# Altium schematic symbol library BARKO_SCHLIB.SchLib: 1064 symbols (part 7 of 11) (continued)
## IC-STM32H743VIH6 (continued)
part C pins: A1 PC14-OSC32 IN (io), A3 PE2-DEBUG_TRACECLK,DEBUG_TRACECLK,SAI1_CK1,SPI4_SCK,SAI1_MCLK_A,SAI4_MCLK_A,QUADSPI_BK1_IO2,SAI4_CK1,ETH_TXD3,FMC_A23, (io), B1 PC15-OSC32 OUT (io), B3 PE3-DEBUG_TRACED0,DEBUG_TRACED0,TIM15_BKIN,SAI1_SD_B,SAI4_SD_B,FMC_A19, (io), B6 PD5-HRTIM_EEV3,USART2_TX,FMC_NWE, (io), B7 PD2-DEBUG_TRACED2,DEBUG_TRACED2,TIM3_ETR,UART5_RX,SDMMC1_CMD,DCMI_D11, (io), C1 PH0-OSC IN (io), C3 PE4-DEBUG_TRACED1,DEBUG_TRACED1,SAI1_D2,DFSDM1_DATIN3,TIM15_CH1N,SPI4_NSS,SAI1_FS_A,SAI4_FS_A,SAI4_D2,FMC_A20,DCMI_D4,LTDC_B0, (io), C4 PE1-LPTIM1_IN2,HRTIM_SCOUT,UART8_TX,FMC_NBL1,DCMI_D3, (io), C6 PD6-SAI1_D1,DFSDM1_CKIN4,DFSDM1_DATIN1,I2S3_SDO/SPI3_MOSI,SAI1_SD_A,USART2_RX,SAI4_SD_A,SAI4_D1,SDMMC2_CK,FMC_NWAIT,DCMI_D10,LTDC_B2, (io), C7 PD3-DFSDM1_CKOUT,I2S2_CK/SPI2_SCK,USART2_CTS/USART2_NSS,FMC_CLK,DCMI_D5,LTDC_G7, (io), D1 PH1-OSC OUT (io), D3 PE5-DEBUG_TRACED2,DEBUG_TRACED2,SAI1_CK2,DFSDM1_CKIN3,TIM15_CH1,SPI4_MISO,SAI1_SCK_A,SAI4_SCK_A,SAI4_CK2,FMC_A21,DCMI_D6,LTDC_G0, (io), D4 PE0-LPTIM1_ETR,TIM4_ETR,HRTIM_SCIN,LPTIM2_ETR,UART8_RX,SAI2_MCLK_A,FMC_NBL0,DCMI_D2, (io), D5 BOOT0 (io), D6 PD7-DFSDM1_DATIN4,I2S1_SDO/SPI1_MOSI,DFSDM1_CKIN1,USART2_CK,SPDIFRX1_IN0,SDMMC2_CMD,FMC_NE1, (io), D7 PD4-HRTIM_FLT3,SAI3_FS_A,USART2_DE/USART2_RTS,FMC_NOE, (io), D8 PD0-DFSDM1_CKIN6,SAI3_SCK_A,UART4_RX,FDCAN1_RX,FMC_D2/FMC_DA2, (io), E1 ~{RST} (in), E3 PE6-DEBUG_TRACED3,DEBUG_TRACED3,TIM1_BKIN2,SAI1_D1,TIM15_CH2,SPI4_MOSI,SAI1_SD_A,SAI4_SD_A,SAI4_D1,SAI2_MCLK_B,TIM1_BKIN2_COMP1/TIM1_BKIN2_COMP2,FMC_A22,DCMI_D7,LTDC_G1, (io), E8 PD1-DFSDM1_DATIN6,SAI3_SD_A,UART4_TX,FDCAN1_TX,FMC_D3/FMC_DA3, (io), F7 PDR ON (io), G6 PE10-TIM1_CH2N,DFSDM1_DATIN4,UART7_CTS,QUADSPI_BK2_IO3,FMC_D7/FMC_DA7, (io), G7 PE14-TIM1_CH4,SPI4_MOSI,SAI2_MCLK_B,FMC_D11/FMC_DA11,LTDC_CLK, (io), G8 PD15-TIM4_CH4,SAI3_MCLK_A,UART8_DE/UART8_RTS,FMC_D1/FMC_DA1, (io), G9 PD11-LPTIM2_IN2,I2C4_SMBA,USART3_CTS/USART3_NSS,QUADSPI_BK1_IO0,SAI2_SD_A,FMC_A16, (io), H5 PE7-TIM1_ETR,DFSDM1_DATIN2,UART7_RX,QUADSPI_BK2_IO0,FMC_D4/FMC_DA4, (io), H6 PE11-TIM1_CH2,DFSDM1_CKIN4,SPI4_NSS,SAI2_SD_B,FMC_D8/FMC_DA8,LTDC_G3, (io), H7 PE15-TIM1_BKIN,FMC_D12/FMC_DA12,TIM1_BKIN_COMP1/TIM1_BKIN_COMP2,LTDC_R7, (io), H8 PD14-TIM4_CH3,SAI3_MCLK_B,UART8_CTS,FMC_D0/FMC_DA0, (io), H9 PD10-DFSDM1_CKOUT,SAI3_FS_B,USART3_CK,FMC_D15/FMC_DA15,LTDC_B3, (io), J5 PE8-TIM1_CH1N,DFSDM1_CKIN2,UART7_TX,QUADSPI_BK2_IO1,FMC_D5/FMC_DA5,COMP2_OUT, (io), J6 PE12-TIM1_CH3N,DFSDM1_DATIN5,SPI4_SCK,SAI2_SCK_B,FMC_D9/FMC_DA9,COMP1_OUT,LTDC_B4, (io), J9 PD9-DFSDM1_DATIN3,SAI3_SD_B,USART3_RX,FMC_D14/FMC_DA14, (io), J10 PD13-LPTIM1_OUT,TIM4_CH2,I2C4_SDA,QUADSPI_BK1_IO3,SAI2_SCK_A,FMC_A18, (io), K5 PE9-TIM1_CH1,DFSDM1_CKOUT,UART7_DE/UART7_RTS,QUADSPI_BK2_IO2,FMC_D6/FMC_DA6, (io), K6 PE13-TIM1_CH3,DFSDM1_CKIN5,SPI4_MISO,SAI2_FS_B,FMC_D10/FMC_DA10,COMP2_OUT,LTDC_DE, (io), K9 PD8-DFSDM1_CKIN3,SAI3_SCK_B,USART3_TX,SPDIFRX1_IN1,FMC_D13/FMC_DA13, (io), K10 PD12-LPTIM1_IN1,TIM4_CH1,LPTIM2_IN1,I2C4_SCL,USART3_DE/USART3_RTS,QUADSPI_BK1_IO1,SAI2_FS_A,FMC_A17, (io)

## IC-STM32L010K8T6
designator U?, comment STM32L010K8T6
16/32-BITS MICROS; Manufacturer: STMicroelectronics; .Creator: M.OZKAN; .PCBCHK: USED; Supplier 1: Digi-Key; Supplier Part Number 1: 497-19365-ND; Manufacturer Part Number: STM32L010K8T6; Stock: 300; Pricing: 1=1.87, 10=1.679, 25=1.584, 100=1.3496, 250=1.2672, 500=1.1088, 1000=0.9187, 2500=0.8554, 5000=0.8237 (USD); RoHS: No; ComponentLink1URL: http://www.farnell.com/datasheets/2710893.pdf?src-supplier=Farnell; ComponentLink1Description: http://www.farnell.com/datasheets/2710893.pdf?src-supplier=Farnell; .SCHCHK: USED
footprint LQFP32
pins: 1 VDD (power), 2 PC14-OSC32 IN (io), 3 PC15-OSC32 OUT (io), 4 ~{RST} (in), 5 VDDA (power), 6 PA0 (io), 7 PA1 (io), 8 PA2 (io), 9 PA3 (io), 10 PA4 (io), 11 PA5 (io), 12 PA6 (io), 13 PA7 (io), 14 PB0 (io), 15 PB1 (io), 16 VSS (power), 17 VDD (power), 18 PA8 (io), 19 PA9 (io), 20 PA10 (io), 21 PA11 (io), 22 PA12 (io), 23 PA13 (io), 24 PA14 (io), 25 PA15 (io), 26 PB3 (io), 27 PB4 (io), 28 PB5 (io), 29 PB6 (io), 30 PB7 (io), 31 BOOT0 (in), 32 VSS (power)

## IC-STM32L431KBU6
designator U?, comment STM32L431KBU6
IC MCU 32BIT 128KB FLASH; Manufacturer: STMicroelectronics; Interface: I2C,SPI,IrDA,UART,USART; Peripherals: Brown-out Detect/Reset,PWM,WDT,DMA; Core Architecture: ARM; Frequency: 80MHz; Number of I/Os: 26; Oscillator Type: Internal; .Creator: M.OZKAN; .PCBCHK: USED; Supplier 1: Digi-Key; Supplier Part Number 1: 497-18595-ND; Manufacturer Part Number: STM32L431KBU6; Stock: 1452; Pricing: 1=4.18, 10=3.75, 25=3.5456, 100=3.0728, 250=2.9152, 500=2.6158, 1000=2.2061, 2500=2.0958, 5000=2.017 (USD); RoHS: No; Case/Package: UFQFPN; Min Operating Temperature: -40°C; Max Operating Temperature: 85°C; Memory Type: FLASH; Packaging: Tray; Memory Size: 128KB; ComponentLink1URL: http://www.st.com/content/ccc/resource/technical/document/reference_manual/group0/b0/ac/3e/8f/6d/21/47/af/DM00151940/files/DM00151940.pdf/jcr:content/translations/en.DM00151940.pdf?src-supplier=Digi-Key; ComponentLink1Description: http://www.st.com/content/ccc/resource/technical/document/reference_manual/group0/b0/ac/3e/8f/6d/21/47/af/DM00151940/files/DM00151940.pdf/jcr:content/translations/en.DM00151940.pdf?src-supplier=Digi-Key; .SCHCHK: USED
footprint STM-UFQFPN32_L (QFN, 32-Leads, Body 5.1x5.1mm, Pitch 0.5mm, Thermal Pad 3.5x3.5mm, IPC High Density)
pins: 1 VDD (power), 2 PC14-OSC32 IN (io), 3 PC15-OSC32 OUT (io), 4 ~{RST} (in), 5 VDDA (power), 6 PA0 (io), 7 PA1 (io), 8 PA2 (io), 9 PA3 (io), 10 PA4 (io), 11 PA5 (io), 12 PA6 (io), 13 PA7 (io), 14 PB0 (io), 15 PB1 (io), 16 VSS (power), 17 VDD (power), 18 PA8 (io), 19 PA9 (io), 20 PA10 (io), 21 PA11 (io), 22 PA12 (io), 23 PA13 (io), 24 PA14 (io), 25 PA15 (io), 26 PB3 (io), 27 PB4 (io), 28 PB5 (io), 29 PB6 (io), 30 PB7 (io), 31 BOOT0 (in), 32 VSS (power), 33 VSS (power)

## IC-TBD62783AFG,EL
designator U?, comment TBD62783AFG,EL  Case/Package: SOIC18
IC LOAD SWITCH 8CH 0.5A 18SOP; Manufacturer: Toshiba; Number of Outputs: 8; Interface: On/Off; Max Output Current: 500mA; Output Configuration: High Side; Washability: OK; .Creator: M.OZKAN; .PCBCHK: USED; Supplier 1: Digi-Key; Manufacturer Part Number: TBD62783AFG,EL; Stock 1: 9707; Pricing 1: 1=1,09000, 10=0,97200, 25=0,92280, 100=0,70860, 250=0,62624, 500=0,59328 (USD); RoHS: Yes; Number of Pins: 18; Min Operating Temperature: -40°C; Max Operating Temperature: 85°C; Packaging: Cut Tape; ComponentLink1URL: https://toshiba.semicon-storage.com/info/docget.jsp?did=30523&prodName=TBD62783AFG&src-supplier=Digi-Key; ComponentLink1Description: https://toshiba.semicon-storage.com/info/docget.jsp?did=30523&prodName=TBD62783AFG&src-supplier=Digi-Key; ComponentLink2URL: http://www.toshiba.semicon-storage.com/info/docget.jsp?did=14247&src-supplier=Digi-Key; ComponentLink2Description: http://www.toshiba.semicon-storage.com/info/docget.jsp?did=14247&src-supplier=Digi-Key; Supplier Part Number 1: TBD62783AFGELCT-ND; .SCHCHK: USED
footprint SOIC18
pins: 1 IN1 (in), 2 IN2 (in), 3 IN3 (in), 4 IN4 (in), 5 IN5 (in), 6 IN6 (in), 7 IN7 (in), 8 IN8 (in), 9 GND, 10 VCC, 11 OUT8 (out), 12 OUT7 (out), 13 OUT6 (out), 14 OUT5 (out), 15 OUT4 (out), 16 OUT3 (out), 17 OUT2 (out), 18 OUT1 (out)

## IC-TCA6408AQPWRQ1
designator U?, comment TCA6408AQ
IC I/O EXPANDER I2C 8B 16TSSOP; Manufacturer: Texas Instruments; Manufacturer Part Number: TCA6408AQPWRQ1; Number of I/Os: 8; Supplier 1: Digi-Key; Supplier Part Number 1: 296-44902-1-ND; Stock: 1976; Pricing: 1=1.6, 10=1.428, 25=1.3552, 100=1.0406, 250=0.9196, 500=0.8712, 1000=0.6776 (USD); RoHS: No; Case/Package: TSSOP; Min Operating Temperature: -40°C; Max Operating Temperature: 125°C; Lead Free: Lead Free; ComponentLink1URL: http://www.ti.com/lit/ds/symlink/tca6408a-q1.pdf?src-supplier=Digi-Key; ComponentLink1Description: http://www.ti.com/lit/ds/symlink/tca6408a-q1.pdf?src-supplier=Digi-Key; ComponentLink2URL: http://www.ti.com/general/docs/suppproductinfo.tsp?distId=10&amp;gotoUrl=http%3A%2F%2Fwww.ti.com%2Flit%2Fgpn%2Ftca6408a-q1&src-supplier=Digi-Key; ComponentLink2Description: http://www.ti.com/general/docs/suppproductinfo.tsp?distId=10&amp;gotoUrl=http%3A%2F%2Fwww.ti.com%2Flit%2Fgpn%2Ftca6408a-q1&src-supplier=Digi-Key
footprint TSSOP16
pins: 1 VCCI (power) "Supply voltage of I2C bus. Connect directly to the VCCI of the external I2C master. Provides voltage leveltranslation", 2 ADDR (in) "Address input. Connect directly to VCCI or ground", 3 ~{RESET} (in) "Active-low reset input. Connect to VCC  through a pullup resistor, if no active connection is used.", 4 P0 (io) "P-port input/output. (Push-pull design structure.) At power on, P0 is configured as an input.", 5 P1 (io) "P-port input/output. (Push-pull design structure.) At power on, P1 is configured as an input.", 6 P2 (io) "P-port input/output. (Push-pull design structure.) At power on, P2 is configured as an input.", 7 P3 (io) "P-port input/output. (Push-pull design structure.) At power on, P3 is configured as an input.", 8 GND (power) "Ground", 9 P4 (io) "P-port input/output. (Push-pull design structure.) At power on, P4 is configured as an input.", 10 P5 (io) "P-port input/output. (Push-pull design structure.) At power on, P5 is configured as an input.", 11 P6 (io) "P-port input/output. (Push-pull design structure.) At power on, P6 is configured as an input.", 12 P7 (io) "P-port input/output. (Push-pull design structure.) At power on, P7 is configured as an input.", 13 ~{INT} (oc) "Interrupt output. Connect to VCCI through a pullup resistor.", 14 SCL (in) "Serial clock bus. Connect to VCCI through a pullup resistor.", 15 SDA (io) "Serial data bus. Connect to VCCI through a pullup resistor.", 16 VCCP (power) "Supply voltage of TCA6408A for P port"

## IC-TCA9534APWR
designator U?, comment TCA9534APWR  Case/Package: TSSOP16
IC I/O EXPANDER I2C 8B 16TSSOP; Manufacturer: Texas Instruments; Number of I/Os: 8; Frequency: 400kHz; Washability: OK; .Creator: M.OZKAN; .PCBCHK: USED; Supplier 1: Digi-Key; Manufacturer Part Number: TCA9534APWR; Stock 1: 2998; Pricing 1: 1=1,29000, 10=1,15200, 25=1,09320, 100=0,83930, 250=0,74172, 500=0,70266, 1000=0,54652 (USD); RoHS: Yes; Mount: Surface Mount; Number of Pins: 16; Contact Plating: Gold; Min Operating Temperature: -40°C; Max Operating Temperature: 85°C; Packaging: Tape and Reel; Interface: I2C; Number of Outputs: 8; Lead Free: Lead Free; ComponentLink1URL: http://www.ti.com/general/docs/lit/getliterature.tsp?genericPartNumber=TCA9534A&&fileType=pdf&src-supplier=Avnet; ComponentLink1Description: http://www.ti.com/general/docs/lit/getliterature.tsp?genericPartNumber=TCA9534A&&fileType=pdf&src-supplier=Avnet; ComponentLink2URL: http://www.ti.com/lit/ds/symlink/tca9534a.pdf?src-supplier=Digi-Key; ComponentLink2Description: http://www.ti.com/lit/ds/symlink/tca9534a.pdf?src-supplier=Digi-Key; ComponentLink3URL: http://www.ti.com/general/docs/lit/getliterature.tsp?genericPartNumber=TCA9534A&&fileType=pdf&src-supplier=Avnet+Asia; ComponentLink3Description: http://www.ti.com/general/docs/lit/getliterature.tsp?genericPartNumber=TCA9534A&&fileType=pdf&src-supplier=Avnet+Asia; ComponentLink4URL: http://www.ti.com/lit/pdf/sszc003?src-supplier=Digi-Key; ComponentLink4Description: http://www.ti.com/lit/pdf/sszc003?src-supplier=Digi-Key; Supplier Part Number 1: 296-40573-1-ND; .SCHCHK: USED
footprint TSSOP16
pins: 1 A0 (in), 2 A1 (in), 3 A2 (in), 4 P0 (io), 5 P1 (io), 6 P2 (io), 7 P3 (io), 8 GND (power), 9 P4 (io), 10 P5 (io), 11 P6 (io), 12 P7 (io), 13 ~{INT} (out), 14 SCL (in), 15 SDA (io), 16 VCC (power)

## IC-TCA9535PWR
designator U?, comment TCA9535PWR
IC I/O EXPANDER I2C 16B 24TSSOP; Manufacturer: Texas Instruments; Min Supply Voltage: 1.65V; Max Supply Voltage: 5.5V; Number of I/Os: 16; Max Frequency: 400kHz; Washability: OK; .Creator: M.OZKAN; .PCBCHK: USED; Supplier 1: Digi-Key; Manufacturer Part Number: TCA9535PWR; Stock 1: 31176; Pricing 1: 1=1.5, 10=1.337, 100=1.0424, 500=0.86108, 1000=0.6798 (USD); Case/Package: TSSOP; Number of Pins: 24; Weight: 0.007478oz; Min Operating Temperature: -40°C; Max Operating Temperature: 85°C; Packaging: Tape and Reel; Package Quantity: 2000; Frequency: 400kHz; REACH SVHC: No SVHC; Lead Free: Lead Free; ComponentLink1URL: http://www.farnell.com/datasheets/1857174.pdf?src-supplier=Element14; ComponentLink1Description: http://www.farnell.com/datasheets/1857174.pdf?src-supplier=Element14; ComponentLink2URL: http://focus.ti.com/lit/ds/symlink/tca9535.pdf?src-supplier=Avnet+Europe; ComponentLink2Description: http://focus.ti.com/lit/ds/symlink/tca9535.pdf?src-supplier=Avnet+Europe; ComponentLink3URL: http://www.ti.com/lit/gpn/tca9535?src-supplier=Mouser; ComponentLink3Description: http://www.ti.com/lit/gpn/tca9535?src-supplier=Mouser; ComponentLink4URL: http://www.ti.com/lit/pdf/ssiy004?src-supplier=Digi-Key; ComponentLink4Description: http://www.ti.com/lit/pdf/ssiy004?src-supplier=Digi-Key; ComponentLink5URL: http://www.ti.com/general/docs/lit/getliterature.tsp?genericPartNumber=TCA9535&&fileType=pdf&src-supplier=Avnet; ComponentLink5Description: http://www.ti.com/general/docs/lit/getliterature.tsp?genericPartNumber=TCA9535&&fileType=pdf&src-supplier=Avnet; ComponentLink6URL: http://www.produktinfo.conrad.com/datenblaetter/1100000-1199999/001187866-da-01-en-IC_I_O_EXPANDER_TCA9535PWR_TSSOP_24_TID.pdf?src-supplier=Conrad; ComponentLink6Description: http://www.produktinfo.conrad.com/datenblaetter/1100000-1199999/001187866-da-01-en-IC_I_O_EXPANDER_TCA9535PWR_TSSOP_24_TID.pdf?src-supplier=Conrad; Supplier Part Number 1: 296-25129-1-ND; .SCHCHK: USED
footprint TSSOP24 - NOEP
pins: 1 ~{INT} (out), 2 A1 (in), 3 A2 (in), 4 P00 (io), 5 P01 (io), 6 P02 (io), 7 P03 (io), 8 P04 (io), 9 P05 (io), 10 P06 (io), 11 P07 (io), 12 GND (power), 13 P10 (io), 14 P11 (io), 15 P12 (io), 16 P13 (io), 17 P14 (io), 18 P15 (io), 19 P16 (io), 20 P17 (io), 21 A0 (in), 22 SCL (in), 23 SDA (io), 24 VCC (power)

## IC-TCA9617BDGKR
designator U?, comment TCA9617BDGKR
IC TRNSLTR BIDIRECTIONAL 8VSSOP; Manufacturer 1: Texas Instruments; Number of Circuits: 1; Number of Outputs: 2; Washability: OK; .Creator: M.OZKAN; .PCBCHK: USED; Supplier 1: Digi-Key; Manufacturer Part Number 1: TCA9617BDGKR; Stock 1: 5832; Pricing 1: 1=1,04000, 10=0,93300, 25=0,88520, 100=0,72730, 250=0,67984, 500=0,60080, 1000=0,47432 (USD); RoHS: Yes; Mount: Surface Mount; Case/Package: VSSOP; Min Operating Temperature: -40°C; Max Operating Temperature: 85°C; Packaging: Tape and Reel; Channel Type: Bidirectional; Package Quantity: 2500; Lead Free: Lead Free; ComponentLink1URL: http://www.ti.com/lit/ds/symlink/tca9617b.pdf?src-supplier=Digi-Key; ComponentLink1Description: http://www.ti.com/lit/ds/symlink/tca9617b.pdf?src-supplier=Digi-Key; ComponentLink2URL: http://www.ti.com/general/docs/lit/getliterature.tsp?genericPartNumber=TCA9617B&&fileType=pdf&src-supplier=Avnet; ComponentLink2Description: http://www.ti.com/general/docs/lit/getliterature.tsp?genericPartNumber=TCA9617B&&fileType=pdf&src-supplier=Avnet; ComponentLink3URL: http://www.ti.com/lit/gpn/tca9617b?src-supplier=Mouser; ComponentLink3Description: http://www.ti.com/lit/gpn/tca9617b?src-supplier=Mouser; Supplier Part Number 1: 296-40579-1-ND; .SCHCHK: USED
footprint MSOP8 (TSOP, 8-Leads, Body 3,00x3,00mm, Pitch 0,65mm, IPC Medium Density)
pins: 1 VCC_A (power), 2 SCLK_A (in), 3 SDATA_A (io), 4 GND (power), 5 EN (in), 6 SDATA_B (io), 7 SCLK_B (out), 8 VCC_B (power)

## IC-TCAN330DR
designator U?, comment TCAN330DR
IC TXRX CAN 3.3V 8SOIC; Manufacturer: Texas Instruments; Data Rate: 1Mbps; Supplier 1: Digi-Key; Supplier Part Number 1: 296-48676-1-ND; Manufacturer Part Number: TCAN330DR; Stock: 6026; Pricing: 1=2.3, 10=2.064, 25=1.9476, 100=1.558, 250=1.3632, 500=1.3243, 1000=1.0517 (USD); RoHS: No; Mount: Surface Mount; Case/Package: SOIC; Number of Pins: 8; Min Operating Temperature: -40°C; Max Operating Temperature: 125°C; Packaging: Cut Tape; Lead Free: Lead Free; ComponentLink1URL: http://www.ti.com/lit/ds/symlink/tcan330.pdf?src-supplier=Digi-Key; ComponentLink1Description: http://www.ti.com/lit/ds/symlink/tcan330.pdf?src-supplier=Digi-Key; ComponentLink2URL: http://www.ti.com/general/docs/suppproductinfo.tsp?distId=10&amp;gotoUrl=http%3A%2F%2Fwww.ti.com%2Flit%2Fgpn%2Ftcan330&src-supplier=Digi-Key; ComponentLink2Description: http://www.ti.com/general/docs/suppproductinfo.tsp?distId=10&amp;gotoUrl=http%3A%2F%2Fwww.ti.com%2Flit%2Fgpn%2Ftcan330&src-supplier=Digi-Key; ComponentLink3URL: http://www.ti.com/lit/gpn/tcan330?src-supplier=Mouser; ComponentLink3Description: http://www.ti.com/lit/gpn/tcan330?src-supplier=Mouser
footprint SOIC8-D0008A_M (SOIC, 8-Leads, Body 5x4mm, Pitch 1.27mm, IPC Low Density)
pins: 1 TX (in), 2 GND (power), 3 VCC (power), 4 RX (out), 5 EN (in), 6 CANL (io), 7 CANH (io), 8 S (in)

## IC-THS7374IPWR
designator U?, comment THS7374
IC AMP BUFFER 14TSSOP; Manufacturer: Texas Instruments; Manufacturer Part Number: THS7374IPWR; Supply Type: Single; Max Supply Voltage: 5V; Number of Circuits: 4; Min Supply Voltage: 3V; Operating Supply Current: 10mA; Output Current per Channel: 90mA; -3db Bandwidth: 9.5MHz; Slew Rate: 130V/µs; Gain: 6dB; Washability: OK; .Creator: M.OZKAN; .PCBCHK: USED; Supplier 1: Mouser; Stock 1: 3762; Pricing 1: 1=0,83000, 10=0,68300, 100=0,51700, 250=0,44000, 500=0,41800, 1000=0,31900 (USD); RoHS: Yes; Mount: Surface Mount; Case/Package: TSSOP; Number of Pins: 14; Weight: 0.002018oz; Contact Plating: Gold; Min Operating Temperature: -40°C; Max Operating Temperature: 85°C; Packaging: Tape and Reel; Number of Channels: 4; Package Quantity: 2000; Nominal Supply Current: 10mA; Radiation Hardening: No; Lead Free: Lead Free; ComponentLink1URL: https://datasheet.ciiva.com/15128/getdatasheetpartid-531071-15128097.pdf?src-supplier=Verical; ComponentLink1Description: https://datasheet.ciiva.com/15128/getdatasheetpartid-531071-15128097.pdf?src-supplier=Verical; ComponentLink2URL: https://datasheet.ciiva.com/16465/slos590b-16465185.pdf?src-supplier=Avnet+Asia; ComponentLink2Description: https://datasheet.ciiva.com/16465/slos590b-16465185.pdf?src-supplier=Avnet+Asia; ComponentLink3URL: https://datasheet.ciiva.com/1824/ths7374-1824882.pdf?src-supplier=Digi-Key; ComponentLink3Description: https://datasheet.ciiva.com/1824/ths7374-1824882.pdf?src-supplier=Digi-Key; ComponentLink4URL: https://datasheet.ciiva.com/2978/ths7374-2978179.pdf?src-supplier=Avnet; ComponentLink4Description: https://datasheet.ciiva.com/2978/ths7374-2978179.pdf?src-supplier=Avnet; ComponentLink5URL: https://datasheet.ciiva.com/2978/ths7374-2978178.pdf?src-supplier=Avnet; ComponentLink5Description: https://datasheet.ciiva.com/2978/ths7374-2978178.pdf?src-supplier=Avnet; ComponentLink6URL: https://datasheet.ciiva.com/26116/slos590b-26116652.pdf?src-supplier=Avnet+Europe; ComponentLink6Description: https://datasheet.ciiva.com/26116/slos590b-26116652.pdf?src-supplier=Avnet+Europe; Supplier Part Number 1: 595-THS7374IPWR; .SCHCHK: USED
footprint THS7374 (TSOP, 14-Leads, Body 5,00x4,40mm, Pitch 0,65mm, IPC Medium Density)
pins: 1 IN1, 2 IN2, 3 IN3, 4 IN4, 5 GND, 6 DISABLE, 7 NC, 8 NC, 9 BYPASS, 10 VS+, 11 OUT4, 12 OUT3, 13 OUT2, 14 OUT1

## IC-THVD1450DRBT
designator IC?, comment THVD1450DRBT
3.3-V to 5-V RS-485 transceiver with ±18-kV IEC ESD protection 8-SON -40 to 125; Manufacturer: Texas Instruments; Supplier 1: Arrow; Manufacturer Part Number: THVD1450DRBT; Stock 1: 500; Pricing 1: 250=1,66000, 500=1,60000, 1250=1,38810, 250=1,66300, 2500=1,62000, 25000=1,35500, 125000=1,19600, 250000=1,19400 (USD); RoHS: No; Supplier Part Number 1: THVD1450DRBT
footprint VSON8 - DRB0008F (DRB0008F  THVD1450)
pins: 1 R (out), 2 ~{RE}, 3 DE, 4 D (in), 5 GND, 6 A (io), 7 B (io), 8 Vcc, 9 EP

## IC-TIOL111DMWR
designator U?, comment TIOL111